# Altium footprint library CapacitorsTHD.PcbLib: 46 footprints (part 3 of 3)
Each footprint in its own frame and in the unit in brackets; x right, y up, seen from the top. Pads: shape width x height; smd on the part's side, far side on the other; paste and mask are expansions set on the pad; w line width, h text height; cw(c..) or ccw(c..) is an arc to the next point about the centre after c.
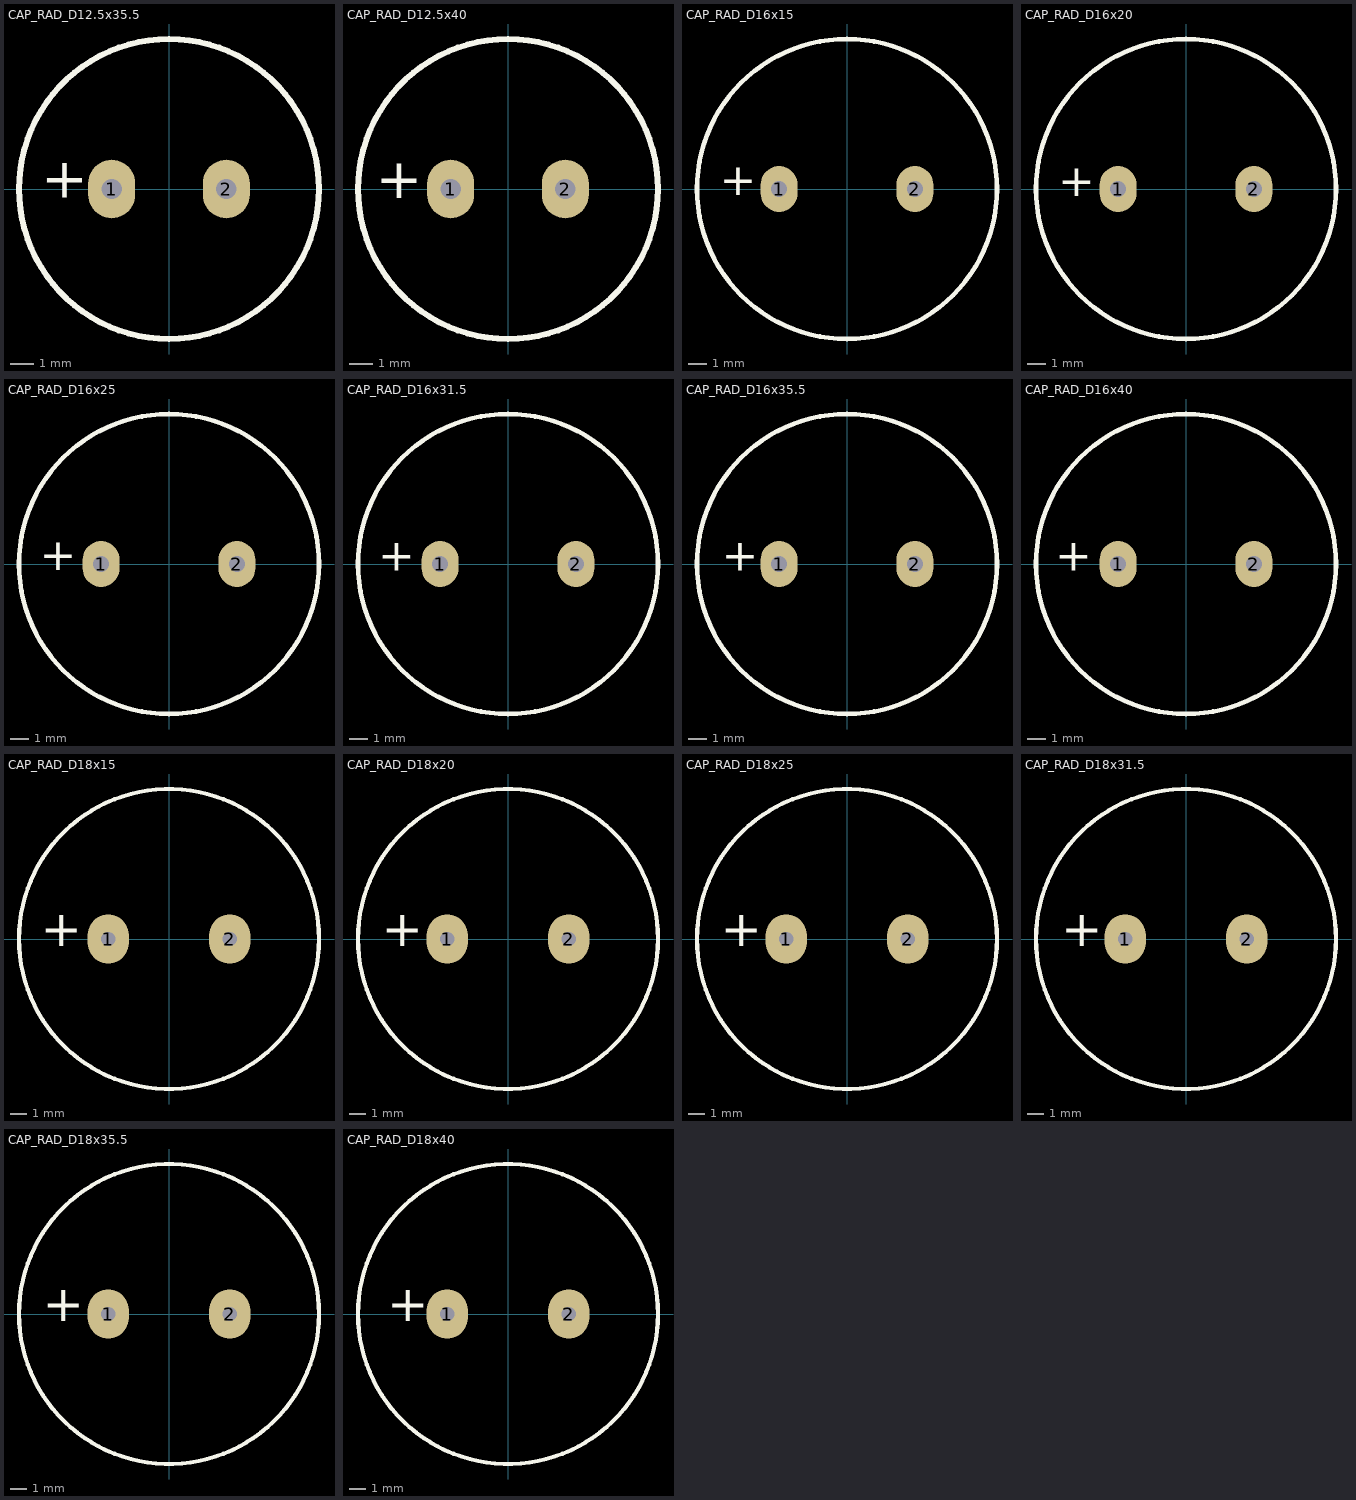
[diagram p2: the footprints below, top view; thin cyan lines are the x and y axes]

## CAP_RAD_D12.5x35.5 [mil]
pads (2):
  oval 80x100 hole 35: 1(-98,0) 2(98,0)
Top Overlay:
  circle w10: c0,0 r256.22
  text "+" at -217.89,-37.89 h120
3D body "CAP_RAD_D12.5x35.5_POL_BK.stp": height 1476.38, standoff -98.43, extent -255.9,-255.74 255.92,255.76

## CAP_RAD_D12.5x40 [mil]
pads (2):
  oval 80x100 hole 35: 1(-98,0) 2(98,0)
Top Overlay:
  circle w10: c0,0 r256.22
  text "+" at -225.89,-38.89 h120
3D body "CAP_RAD_D12.5x40_POL_BK.stp": height 1653.54, standoff -98.43, extent -255.89,-255.74 255.91,255.75

## CAP_RAD_D16x15 [mil]
pads (2):
  oval 80x100 hole 35: 1(-148,0) 2(148,0)
Top Overlay:
  circle w10: c0,0 r326.96
  text "+" at -277.89,-36.89 h120
3D body "CAP_RAD_D16x15_POL_BK.stp": height 649.61, standoff -98.43, extent -324.8,-324.78 324.81,324.79

## CAP_RAD_D16x20 [mil]
pads (2):
  oval 80x100 hole 35: 1(-148,0) 2(148,0)
Top Overlay:
  circle w10: c0,0 r326.96
  text "+" at -278.89,-38.89 h120
3D body "CAP_RAD_D16x20_POL_BK.stp": height 866.14, standoff -98.43, extent -324.8,-324.78 324.81,324.79

## CAP_RAD_D16x25 [mil]
pads (2):
  oval 80x100 hole 35: 1(-148,0) 2(148,0)
Top Overlay:
  circle w10: c0,0 r326.96
  text "+" at -281.89,-36.89 h120
3D body "CAP_RAD_D16x25_POL_BK.stp": height 1062.99, standoff -98.43, extent -324.8,-324.79 324.81,324.8

## CAP_RAD_D16x31.5 [mil]
pads (2):
  oval 80x100 hole 35: 1(-148,0) 2(148,0)
Top Overlay:
  circle w10: c0,0 r326.96
  text "+" at -282.89,-37.89 h120
3D body "CAP_RAD_D16x31.5_POL_BK.stp": height 1318.9, standoff -98.43, extent -324.8,-324.68 324.81,324.69

## CAP_RAD_D16x35.5 [mil]
pads (2):
  oval 80x100 hole 35: 1(-148,0) 2(148,0)
Top Overlay:
  circle w10: c0,0 r326.96
  text "+" at -272.89,-37.89 h120
3D body "CAP_RAD_D16x35.5_POL_BK.stp": height 1476.38, standoff -98.43, extent -324.8,-324.64 324.81,324.66

## CAP_RAD_D16x40 [mil]
pads (2):
  oval 80x100 hole 35: 1(-148,0) 2(148,0)
Top Overlay:
  circle w10: c0,0 r326.96
  text "+" at -284.89,-37.89 h120
3D body "CAP_RAD_D16x40_POL_BK.stp": height 1653.54, standoff -98.43, extent -324.8,-324.72 324.81,324.74

## CAP_RAD_D18x15 [mil]
pads (2):
  oval 100x120 hole 35: 1(-148,0) 2(148,0)
Top Overlay:
  circle w10: c0,0 r365.41
  text "+" at -312.59,-47.33 h150
3D body "CAP_RAD_D18x15_POL_BK.stp": height 649.61, standoff -98.43, extent -364.17,-364.16 364.18,364.18

## CAP_RAD_D18x20 [mil]
pads (2):
  oval 100x120 hole 35: 1(-148,0) 2(148,0)
Top Overlay:
  circle w10: c0,0 r365.41
  text "+" at -307.59,-47.33 h150
3D body "CAP_RAD_D18x20_POL_BK.stp": height 866.14, standoff -98.43, extent -364.17,-364.16 364.18,364.17

## CAP_RAD_D18x25 [mil]
pads (2):
  oval 100x120 hole 35: 1(-148,0) 2(148,0)
Top Overlay:
  circle w10: c0,0 r365.41
  text "+" at -307.59,-47.33 h150
3D body "CAP_RAD_D18x25_POL_BK.stp": height 1062.99, standoff -98.43, extent -364.17,-364.08 364.18,364.09

## CAP_RAD_D18x31.5 [mil]
pads (2):
  oval 100x120 hole 35: 1(-148,0) 2(148,0)
Top Overlay:
  circle w10: c0,0 r365.41
  text "+" at -303.59,-47.33 h150
3D body "CAP_RAD_D18x31.5_POL_BK.stp": height 1318.9, standoff -98.43, extent -364.16,-364.12 364.18,364.13

## CAP_RAD_D18x35.5 [mil]
pads (2):
  oval 100x120 hole 35: 1(-148,0) 2(148,0)
Top Overlay:
  circle w10: c0,0 r365.41
  text "+" at -307.59,-47.33 h150
3D body "CAP_RAD_D18x35.5_POL_BK.stp": height 1476.38, standoff -98.43, extent -364.16,-364.03 364.18,364.04

## CAP_RAD_D18x40 [mil]
pads (2):
  oval 100x120 hole 35: 1(-148,0) 2(148,0)
Top Overlay:
  circle w10: c0,0 r365.41
  text "+" at -293.59,-47.33 h150
3D body "CAP_RAD_D18x40_POL_BK.stp": height 1653.54, standoff -98.43, extent -364.17,-363.99 364.18,364.01